# Altium footprint library Connectors.PcbLib: 101 footprints (part 6 of 7)
Each footprint in its own frame and in the unit in brackets; x right, y up, seen from the top. Pads: shape width x height; smd on the part's side, far side on the other; paste and mask are expansions set on the pad; w line width, h text height; cw(c..) or ccw(c..) is an arc to the next point about the centre after c.
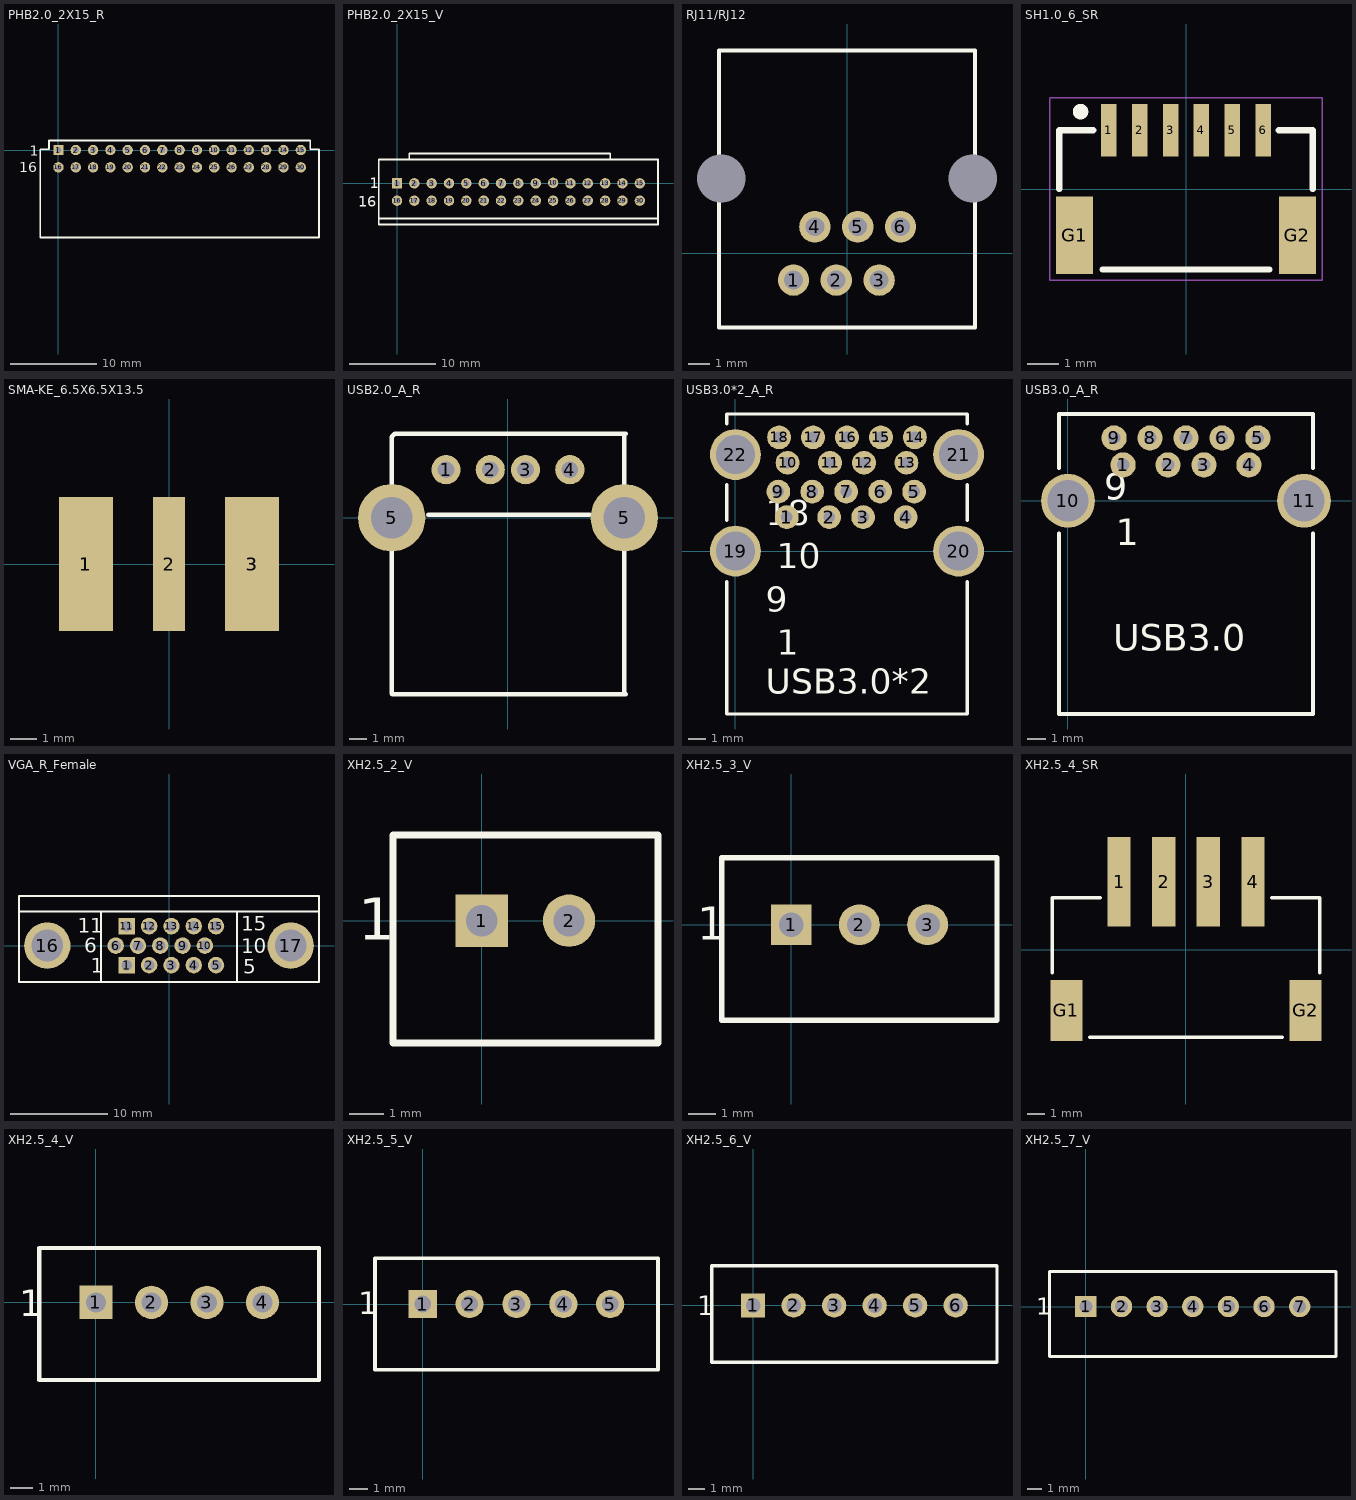
[diagram p5: the footprints below, top view; thin cyan lines are the x and y axes]

## PHB2.0_2X15_R [mm] "PHB2.0 , 15-Pin, Dual row, Right Angle"
pads (30):
  rect 1.2x1.2 hole 0.7 paste+0 mask+0.1: 1(0,0)
  round 1.2 hole 0.7 paste+0 mask+0.1: 2(2,0) 3(4,0) 4(6,0) 5(8,0) 6(10,0) 7(12,0) 8(14,0) 9(16,0) 10(18,0) 11(20,0) 12(22,0) 13(24,0) 14(26,0) 15(28,0) 16(0,-2) 17(2,-2) 18(4,-2) 19(6,-2) 20(8,-2) 21(10,-2) 22(12,-2) 23(14,-2) 24(16,-2) 25(18,-2) 26(20,-2) 27(22,-2) 28(24,-2) 29(26,-2) 30(28,-2)
Top Overlay:
  lines w0.2: -1.1,1.1 -1.1,0.1 -2.1,0.1 -2.1,-10.1 30.1,-10.1 30.1,0.1 29.1,0.1 29.1,1.1 -1.09,1.1
  text "1" at -3.33,-0.67 h1.2
  text "16" at -4.56,-2.56 h1.2
3D body "878333019.stp": height 7.25, standoff -1.21, extent -2.325,-8.4 30.325,0.25

## PHB2.0_2X15_V [mm] "PHB2.0 , 15-Pin, Dual row, Vertical"
pads (30):
  rect 1.2x1.2 hole 0.7 paste+0 mask+0.1: 1(0,0)
  round 1.2 hole 0.7 paste+0 mask+0.1: 2(2,0) 3(4,0) 4(6,0) 5(8,0) 6(10,0) 7(12,0) 8(14,0) 9(16,0) 10(18,0.055) 11(20,0) 12(22,0) 13(24,0) 14(26,0) 15(28,0) 16(0,-2) 17(2,-2) 18(4,-2) 19(6,-2) 20(8,-2) 21(10,-2) 22(12,-2) 23(14,-2) 24(16,-2) 25(18,-2) 26(20,-2) 27(22,-2) 28(24,-2) 29(26,-2) 30(28,-2)
Top Overlay:
  lines w0.2: -2.1,-4.05 30.1,-4.05 ; 1.4,2.755 1.4,3.45 24.6,3.45 24.6,2.765 ; -2.1,-4.75 -2.1,2.75 30.1,2.75 30.1,-4.75 -2.1,-4.75
  text "1" at -3.16,-0.58 h1.2
  text "16" at -4.5,-2.69 h1.2
3D body "878313019.stp": height 7.7, standoff -1.2, extent -2.325,-4.15 30.325,2.15

## RJ11/RJ12 [mm]
pads (8):
  round 0 hole 2.3 unplated paste+0 mask+0.1: 0(-6,3.57) 1(6,3.57)
  round 1.5 hole 0.9 paste+0 mask+0.1: 1(-2.55,-1.27) 2(-0.51,-1.27) 3(1.53,-1.27) 4(-1.53,1.27) 5(0.51,1.27) 6(2.55,1.27)
Top Overlay:
  lines w0.2: -6.1,-3.53 -6.1,9.67 6.1,9.67 6.1,-3.53 -6.1,-3.53
3D body "rj15.stp": height 16.24, standoff -1.56, extent -7.14,-2.92 7.16,10.08

## SH1.0_6_SR [mm] "SH Connector, 1.0mm Pitch,  6 pin, Sueface mount, Right angle"
pads (8):
  rect 0.5x1.7 smd paste+0 mask+0.1: 1(-2.5,1.9) 2(-1.5,1.9) 3(-0.5,1.9) 4(0.5,1.9) 5(1.5,1.9) 6(2.5,1.9)
  rect 1.2x2.5 smd paste+0 mask+0.1: G1(-3.6,-1.5) G2(3.6,-1.5)
Top Overlay:
  circle w0.25: c-3.41,2.5 r0.125
  lines w0.2: -4.1,0 -4.1,1.9 -3,1.9 ; -2.7,-2.6 2.7,-2.6 ; 3,1.9 4.1,1.9 4.1,0
Mechanical 15:
  lines w0.05: -4.4,2.92 -4.4,-2.95 4.4,-2.95 4.4,2.95 -4.4,2.95
3D body "SM06B-SRSS-TB.STEP": height 2.96, standoff 0, extent -4,-2.5 4,2.45

## SMA-KE_6.5X6.5X13.5 [mm] "SMA Receptacle, Edge mount, 6.5mmX6.5mm"
pads (5):
  rect 2x5 smd paste+0 mask+0.1: 1(-3.1,0) 3(3.1,0)
  rect 2x5 smd far side paste+0 mask+0.1: 1(-3.1,0) 3(3.1,0)
  rect 1.2x5 smd paste+0 mask+0.1: 2(0,0)
3D body "SAMTEC_SMA-J-P-H-ST-EM1.STEP": height 3.95, standoff -2.4, extent -3.175,-12.13 3.175,1.2

## USB2.0_A_R [mil]
pads (6):
  round 65 hole 37: 1(-137.8,106.69) 2(-39.3,106.69) 3(39.2,106.69) 4(137.8,106.69)
  round 150 hole 93: 5(-258.8,-0.31) 5(259.2,-0.31)
Top Overlay:
  lines w10: -177.8,6.69 182.2,6.69 ; 259.2,183.69 259.2,-0.31 259.2,-370.31 259.2,-390.31 262.2,-393.31 -257.8,-393.31 -258.8,-392.31 -258.8,-0.31 -258.8,179.69 -251.8,186.69 262.2,186.69
3D body "USB2.0_A_R_2.stp": height 304.33, standoff -145.62, extent -314.94,-403.54 314.94,197.24

## USB3.0*2_A_R [mm] "USB3.0, Dual Port Stacked, Type A Receptacle, Surface Mount, Right Angle"
height 5
pads (22):
  round 1.4 hole 0.7: 1(3.024,2) 2(5.524,2) 3(7.524,2) 4(10.024,2) 5(10.524,3.5) 6(8.524,3.5) 7(6.524,3.5) 8(4.524,3.5) 9(2.524,3.5) 10(3.07,5.2) 11(5.57,5.2) 12(7.57,5.2) 13(10.07,5.2) 14(10.57,6.7) 15(8.57,6.7) 16(6.57,6.7) 17(4.57,6.7) 18(2.57,6.7)
  round 3 hole 2.3: 19(0,0) 20(13.14,0) 21(13.14,5.68) 22(0,5.68)
Top Overlay:
  lines w0.2: -0.5,-1.8 -0.5,-9.59 13.64,-9.59 13.64,-1.8 ; -0.5,1.8 -0.5,3.9 ; -0.5,7.5 -0.5,8.07 13.64,8.07 13.64,7.5 ; 13.64,1.8 13.64,3.9
  text "18 /  10 / 9 /  1" at 1.778,-6.604 h2.54
  text "USB3.0*2" at 1.778,-8.89 h2.54
3D body "484060003.stp": height 16.2, standoff -3.2, extent -1.319,-9.492 14.351,7.968

## USB3.0_A_R [mm] "USB3.0, Type A Receptacle, Surface Mount, Right Angle"
height 5
pads (11):
  round 1.4 hole 0.7: 1(3.07,2) 2(5.57,2) 3(7.57,2) 4(10.07,2) 5(10.57,3.5) 6(8.57,3.5) 7(6.57,3.5) 8(4.57,3.5) 9(2.57,3.5)
  round 3 hole 2.3: 10(0,0) 11(13.14,0)
Top Overlay:
  lines w0.2: -0.5,-1.8 -0.5,-11.87 13.64,-11.87 13.64,-1.8 ; -0.5,1.8 -0.5,4.83 13.64,4.83 13.64,1.8
  text "9 /  1" at 2.01,-2.99 h2.54
  text "USB3.0" at 2.52,-8.86 h2.54
3D body "484050004.stp": height 7.96, standoff -3.64, extent -1.16,-11.77 14.3,4.73

## VGA_R_Female [mm]
pads (17):
  rect 1.69x1.69 hole 1.09: 1(-4.33,-2) 11(-4.33,2)
  round 1.69 hole 1.09: 2(-2.04,-2) 3(0.25,-2) 4(2.54,-2) 5(4.83,-2) 6(-5.475,0) 7(-3.185,0) 8(-0.895,0) 9(1.395,0) 10(3.685,0) 12(-2.04,2) 13(0.25,2) 14(2.54,2) 15(4.83,2)
  round 4.76 hole 3.26: 16(-12.495,0) 17(12.495,0)
Top Overlay:
  lines w0.2: -15.4,3.5 15.4,3.5 ; -7,-3.72 -7,3.5 ; 7,-3.72 7,3.5 ; -15.4,-3.72 -15.4,5.08 15.4,5.08 15.4,-3.72 -15.4,-3.72
  text "15" at 7.44,1.52 h1.5
  text "11" at -9.36,1.33 h1.5
  text "1" at -8.02,-2.77 h1.5
  text "5" at 7.6,-2.87 h1.5
  text "10" at 7.44,-0.77 h1.5
  text "6" at -8.71,-0.73 h1.5
3D body "vga.stp": height 12.55, standoff -3.9, extent -15.42,-3.9 15.42,10.85

## XH2.5_2_V [mm] "XH Connector, 2.5mm Pitch, 2-Pin, Vertical"
pads (2):
  rect 1.5x1.5 hole 0.9 paste+0 mask+0.1: 1(0,0)
  round 1.5 hole 0.9 paste+0 mask+0.1: 2(2.5,0)
Top Overlay:
  lines w0.2: -2.55,-3.5 5.05,-3.5 5.05,2.45 -2.55,2.45 -2.55,-3.5
  text "1" at -3.55,-0.54 h1.2
3D body "B2B-XH-A.STEP": height 7, standoff -3.4, extent -2.45,-3.4 4.95,2.35

## XH2.5_3_V [mm] "XH Connector, 2.5mm Pitch, 3-Pin, Vertical"
pads (3):
  rect 1.5x1.5 hole 0.9 paste+0 mask+0.1: 1(0,0)
  round 1.5 hole 0.9 paste+0 mask+0.1: 2(2.5,0) 3(5,0)
Top Overlay:
  lines w0.2: -2.55,-3.5 -2.55,2.45 7.55,2.45 7.55,-3.5 -2.55,-3.5
  text "1" at -3.46,-0.56 h1.2
3D body "B3B-XH-A.STEP": height 7, standoff -3.4, extent -2.45,-3.4 7.45,2.35

## XH2.5_4_SR [mm] "XH Connector, 2.5mm Pitch,  4pin, Sueface mount, Right angle"
pads (6):
  rect 1.3x5 smd paste+0 mask+0.1: 1(-3.75,3.8) 2(-1.25,3.8) 3(1.25,3.8) 4(3.75,3.8)
  rect 1.8x3.4 smd paste+0 mask+0.1: G1(-6.7,-3.4) G2(6.7,-3.4)
Top Overlay:
  lines w0.2: -7.5,-1.3 -7.5,2.9 -4.8,2.9 ; -5.4,-4.9 5.4,-4.9 ; 4.8,2.9 7.5,2.9 7.5,-1.3
3D body "xh2_54-4p_卧贴.stp": height 6.3, standoff -0.02, extent -7.5,-4.9 7.5,5.3

## XH2.5_4_V [mm] "XH Connector, 2.5mm Pitch, 4-Pin, Vertical"
pads (4):
  rect 1.5x1.5 hole 0.9 paste+0 mask+0.1: 1(0,0)
  round 1.5 hole 0.9 paste+0 mask+0.1: 2(2.5,0) 3(5,0) 4(7.5,0)
Top Overlay:
  lines w0.2: -2.55,-3.5 10.05,-3.5 10.05,2.45 -2.55,2.45 -2.55,-3.5
  text "1" at -3.47,-0.62 h1.2
3D body "B4B-XH-A.STEP": height 7, standoff -3.4, extent -2.45,-3.4 9.95,2.35

## XH2.5_5_V [mm] "XH Connector, 2.5mm Pitch, 5-Pin, Vertical"
pads (5):
  rect 1.5x1.5 hole 0.9 paste+0 mask+0.1: 1(0,0)
  round 1.5 hole 0.9 paste+0 mask+0.1: 2(2.5,0) 3(5,0) 4(7.5,0) 5(10,0)
Top Overlay:
  lines w0.2: -2.55,-3.5 -2.55,2.45 12.55,2.45 12.55,-3.5 -2.55,-3.5
  text "1" at -3.45,-0.55 h1.2
3D body "B5B-XH-A.STEP": height 7, standoff -3.4, extent -2.45,-3.4 12.45,2.35

## XH2.5_6_V [mm] "XH Connector, 2.5mm Pitch, 6-Pin, Vertical"
pads (6):
  rect 1.5x1.5 hole 0.9 paste+0 mask+0.1: 1(0,0)
  round 1.5 hole 0.9 paste+0 mask+0.1: 2(2.5,0) 3(5,0) 4(7.5,0) 5(10,0) 6(12.5,0)
Top Overlay:
  lines w0.2: -2.55,-3.5 -2.55,2.45 15.05,2.45 15.05,-3.5 -2.55,-3.5
  text "1" at -3.46,-0.6 h1.2
3D body "B6B-XH-A.STEP": height 7, standoff -3.4, extent -2.45,-3.4 14.95,2.35

## XH2.5_7_V [mm] "XH Connector, 2.5mm Pitch, 7-Pin, Vertical"
pads (7):
  rect 1.5x1.5 hole 0.9 paste+0 mask+0.1: 1(0,0)
  round 1.5 hole 0.9 paste+0 mask+0.1: 2(2.5,0) 3(5,0) 4(7.5,0) 5(10,0) 6(12.5,0) 7(15,0)
Top Overlay:
  lines w0.2: -2.55,-3.5 17.55,-3.5 17.55,2.45 -2.55,2.45 -2.55,-3.5
  text "1" at -3.5,-0.58 h1.2
3D body "B7B-XH-A.STEP": height 7, standoff -3.4, extent -2.45,-3.4 17.45,2.35